# Altium footprint library 常用元件封装库.PcbLib: 1310 footprints (part 4 of 83)
Each footprint in its own frame and in the unit in brackets; x right, y up, seen from the top. Pads: shape width x height; smd on the part's side, far side on the other; paste and mask are expansions set on the pad; w line width, h text height; cw(c..) or ccw(c..) is an arc to the next point about the centre after c.
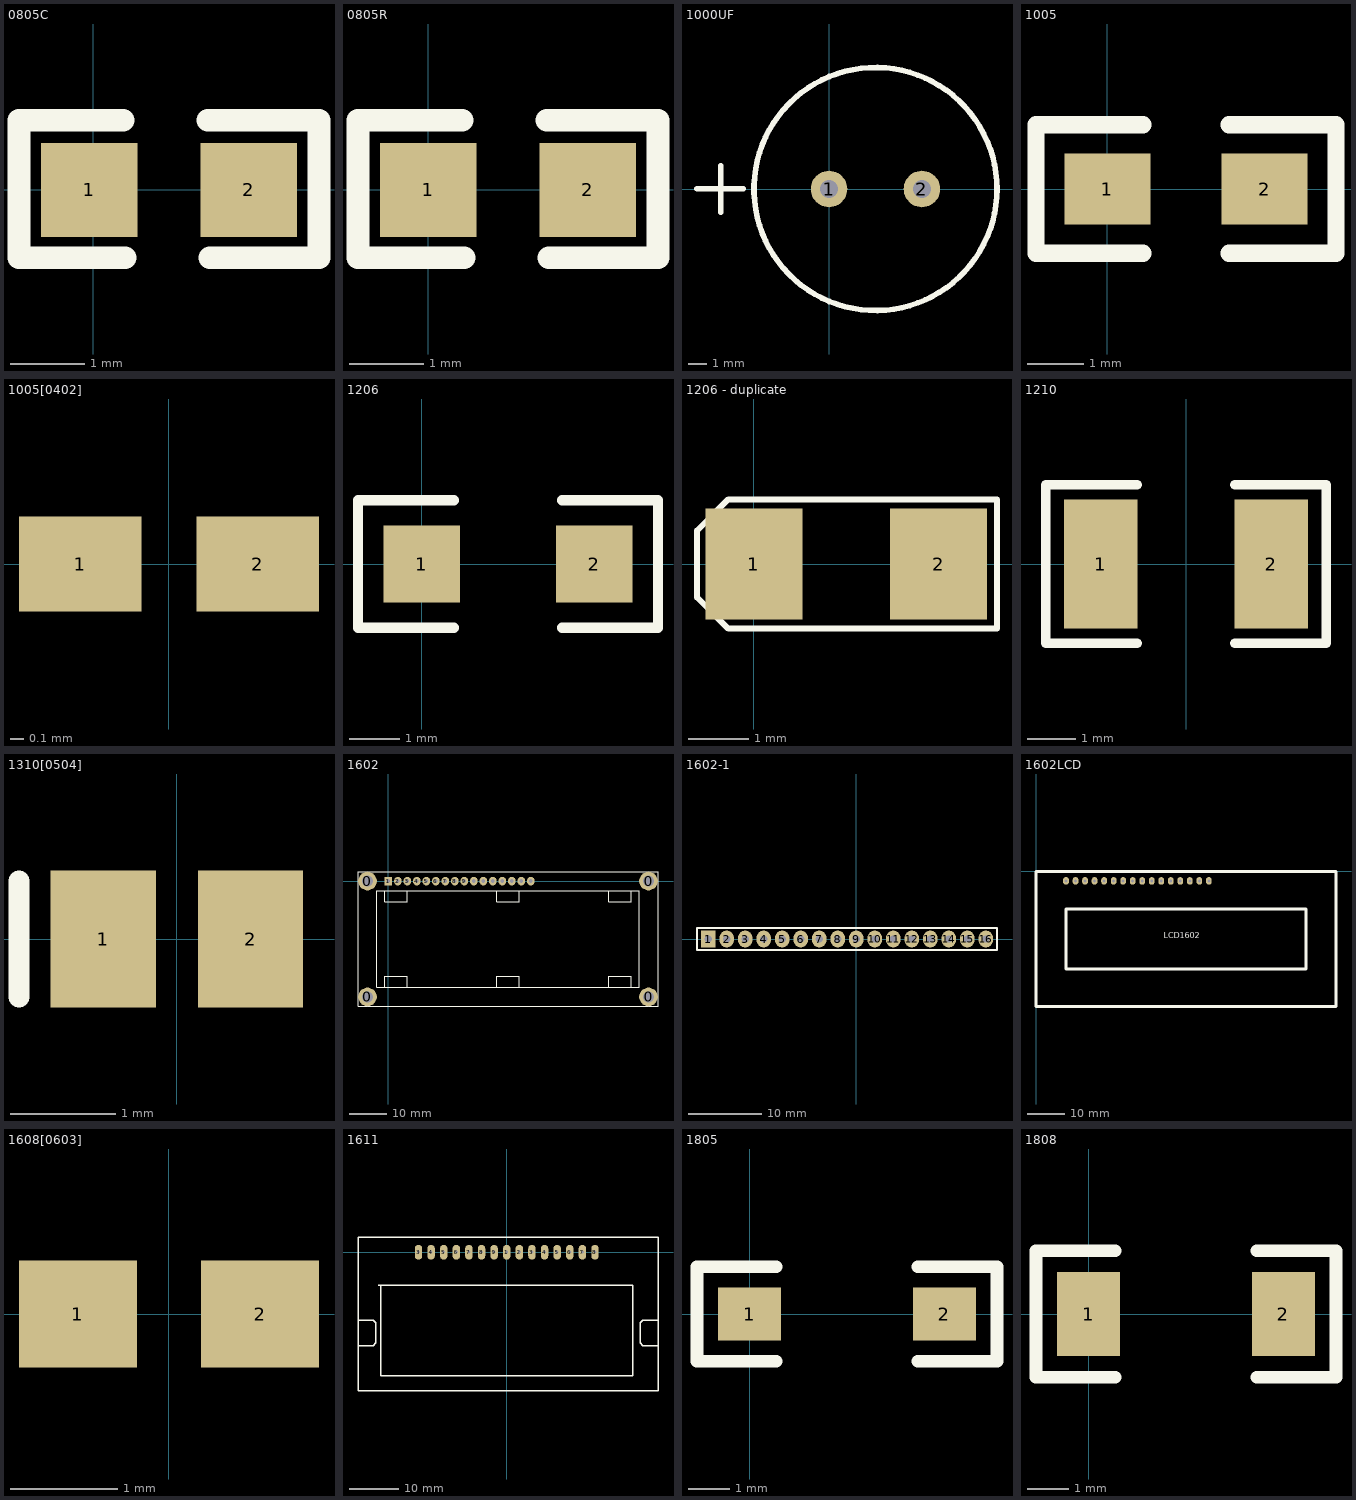
[diagram p3: the footprints below, top view; thin cyan lines are the x and y axes]

## 0805C [mm]
pads (2):
  rect 1.3x1.27 smd: 1(-0.051,0) 2(2.099,0)
Top Overlay:
  lines w0.305: 0.406,0.94 -1.001,0.94 -1.001,-0.914 0.432,-0.914 ; 1.549,0.94 3.049,0.94 3.049,-0.914 1.575,-0.914
3D body "SW3DPS-CAPACITOR 0805-DEFAULT.STEP": height 0.73, standoff -0.03, extent 0.042,-0.655 2.042,0.655

## 0805R [mm]
pads (2):
  rect 1.3x1.27 smd: 1(0,0) 2(2.15,0)
Top Overlay:
  lines w0.305: 0.457,0.94 -0.95,0.94 -0.95,-0.914 0.483,-0.914 ; 1.6,0.94 3.1,0.94 3.1,-0.914 1.626,-0.914
3D body "User Library-RES_2013-0805.STEP": height 0.76, standoff 0, extent -0.083,-0.7 2.217,0.65

## 1000UF [mm]
pads (2):
  round 2 hole 1: 1(0,0) 2(5.08,0)
Top Overlay:
  circle w0.305: c2.54,0 r6.65
  lines w0.305: -7.227,0.025 -4.687,0.025 ; -5.927,-1.27 -5.927,1.27

## 1005 [mil]
pads (2):
  rect 60x50 smd: 1(0,0) 2(110,0)
Top Overlay:
  lines w12: 25,-45 -50,-45 -50,45 25,45 ; 85,-45 160,-45 160,45 85,45

## 1005[0402] [mm] "Chip Resistor; Body 1.1 x 0.5 mm (LxW typ)"
height 2.54
pads (2):
  rect 0.9x0.7 smd: 1(-0.65,0) 2(0.65,0)

## 1206 [mil]
pads (2):
  rect 60x60 smd: 1(0,0) 2(135,0)
Top Overlay:
  lines w8: 25,-50 -50,-50 -50,50 25,50 ; 110,-50 185,-50 185,50 110,50
3D body "User Library-RES_0603.STEP": height 20, standoff -0.08, extent 7.01,-30 132.99,32.99

## 1206 - duplicate [mil]
pads (2):
  rect 63x72 smd: 1(0,0) 2(120,0)
Top Overlay:
  lines w4: -37,-21.6 -37,-17 -37,17.49 -37,21.6 -16.6,42 158,42 158,-42 -16.6,-42 -37,-21.6

## 1210 [mil] "贴片元件"
height 59.06
pads (2):
  rect 60x106.3 smd: 1(-70,0) 2(70,0)
Top Overlay:
  lines w7.87: -40,-65 -115,-65 -115,65 -40,65 ; 40,-65 115,-65 115,65 40,65
3D body: height 39.37, standoff 0, extent -65,-50 65,50

## 1310[0504] [mm] "Chip Capacitor; Body 1.2 x 1.0 mm (LxW typ)"
height 1.35
pads (2):
  rect 1x1.3 smd: 1(-0.7,0) 2(0.7,0)
Top Overlay:
  lines w0.2: -1.5,-0.55 -1.5,0.55

## 1602 [mm]
pads (20):
  round 5 hole 3: 0(-5.588,-30.988) 0(-5.588,0) 0(69.596,-30.988) 0(69.596,0)
  rect 2x2.3 hole 1: 1(0,0)
  oval 2x2.3 hole 1: 2(2.54,0) 3(5.08,0) 4(7.62,0) 5(10.16,0) 6(12.7,0) 7(15.24,0) 8(17.78,0) 9(20.32,0) 10(22.86,0) 11(25.4,0) 12(27.94,0) 13(30.48,0) 14(33.02,0) 15(35.56,0) 16(38.1,0)
Top Overlay:
  lines w0.254: -1.016,-28.448 -1.016,-25.4 5.08,-25.4 5.08,-28.448 ; -1.016,-2.54 -1.016,-5.588 5.08,-5.588 5.08,-2.54 ; 28.956,-28.448 28.956,-25.4 35.052,-25.4 35.052,-28.448 ; 28.956,-2.54 28.956,-5.588 35.052,-5.588 35.052,-2.54 ; 58.928,-28.448 58.928,-25.4 65.024,-25.4 65.024,-28.448 ; 58.928,-2.54 58.928,-5.588 65.024,-5.588 65.024,-2.54 ; -8.128,-33.528 -8.128,2.54 72.136,2.54 72.136,-33.528 -8.128,-33.528 ; -3.048,-28.448 -3.048,-2.54 67.056,-2.54 67.056,-28.448 -3.048,-28.448

## 1602-1 [mm]
pads (16):
  rect 2x2.3 hole 1: 1(-20.32,0)
  oval 2x2.3 hole 1: 2(-17.78,0) 3(-15.24,0) 4(-12.7,0) 5(-10.16,0) 6(-7.62,0) 7(-5.08,0) 8(-2.54,0) 9(0,0) 10(2.54,0) 11(5.08,0) 12(7.62,0) 13(10.16,0) 14(12.7,0) 15(15.24,0) 16(17.78,0)
Top Overlay:
  lines w0.254: -21.336,-1.524 18.796,-1.524 19.304,-1.524 19.304,1.524 18.288,1.524 ; -20.828,-1.524 -21.844,-1.524 -21.844,1.524 18.796,1.524

## 1602LCD [mil] "LCD module 16*2 char"
pads (16):
  oval 60x80 hole 30: 1(314.96,-98.43) 2(414.96,-98.43) 3(514.96,-98.43) 4(614.96,-98.43) 5(714.96,-98.43) 6(814.96,-98.43) 7(914.96,-98.43) 8(1014.96,-98.43) 9(1114.96,-98.43) 10(1214.96,-98.43) 11(1314.96,-98.43) 12(1414.96,-98.43) 13(1514.96,-98.43) 14(1614.96,-98.43) 15(1714.96,-98.43) 16(1814.96,-98.43)
Top Overlay:
  lines w30: 0,-1417.32 0,0 3149.61,0 3149.61,-1417.32 0,-1417.32 ; 314.96,-1023.62 314.96,-393.7 2834.65,-393.7 2834.65,-1023.62 314.96,-1023.62
  text "LCD1602" at 1340,-700 h60

## 1608[0603] [mm] "Chip Capacitor; Body 1.6 x 0.8 mm (LxW typ)"
height 1.35
pads (2):
  rect 1.1x1 smd: 1(-0.85,0) 2(0.85,0)

## 1611 [mm]
pads (15):
  oval 1.5x3 hole 0.6: 1(0,0) 2(2.54,0) 3(-17.78,0) 3(5.08,0) 4(-15.24,0) 4(7.62,0) 5(-12.7,0) 5(10.16,0) 6(-10.16,0) 6(12.7,0) 7(-7.62,0) 7(15.24,0) 8(-5.08,0) 8(17.78,0) 9(-2.54,0)
Top Overlay:
  lines w0.254: -29.972,-18.796 -26.924,-18.796 -26.416,-18.288 -26.416,-14.224 -26.924,-13.716 -29.972,-13.716 ; -25.908,-6.604 25.4,-6.604 25.4,-24.892 -25.4,-24.892 -25.4,-6.604 ; 30.48,-18.796 27.432,-18.796 26.924,-18.288 26.924,-14.224 27.432,-13.716 30.48,-13.716 ; -29.972,-27.94 30.48,-27.94 30.48,3.048 -29.972,3.048 -29.972,-27.94

## 1805 [mil]
pads (2):
  rect 60x50 smd: 1(0,0) 2(185,0)
Top Overlay:
  lines w12: 25,-45 -50,-45 -50,45 25,45 ; 160,-45 235,-45 235,45 160,45

## 1808 [mil]
pads (2):
  rect 60x80 smd: 1(0,0) 2(185,0)
Top Overlay:
  lines w12: 25,-60 -50,-60 -50,60 25,60 ; 160,-60 235,-60 235,60 160,60